# Altium footprint library Transformers.PcbLib: 102 footprints (part 7 of 7)
Each footprint in its own frame and in the unit in brackets; x right, y up, seen from the top. Pads: shape width x height; smd on the part's side, far side on the other; paste and mask are expansions set on the pad; w line width, h text height; cw(c..) or ccw(c..) is an arc to the next point about the centre after c.
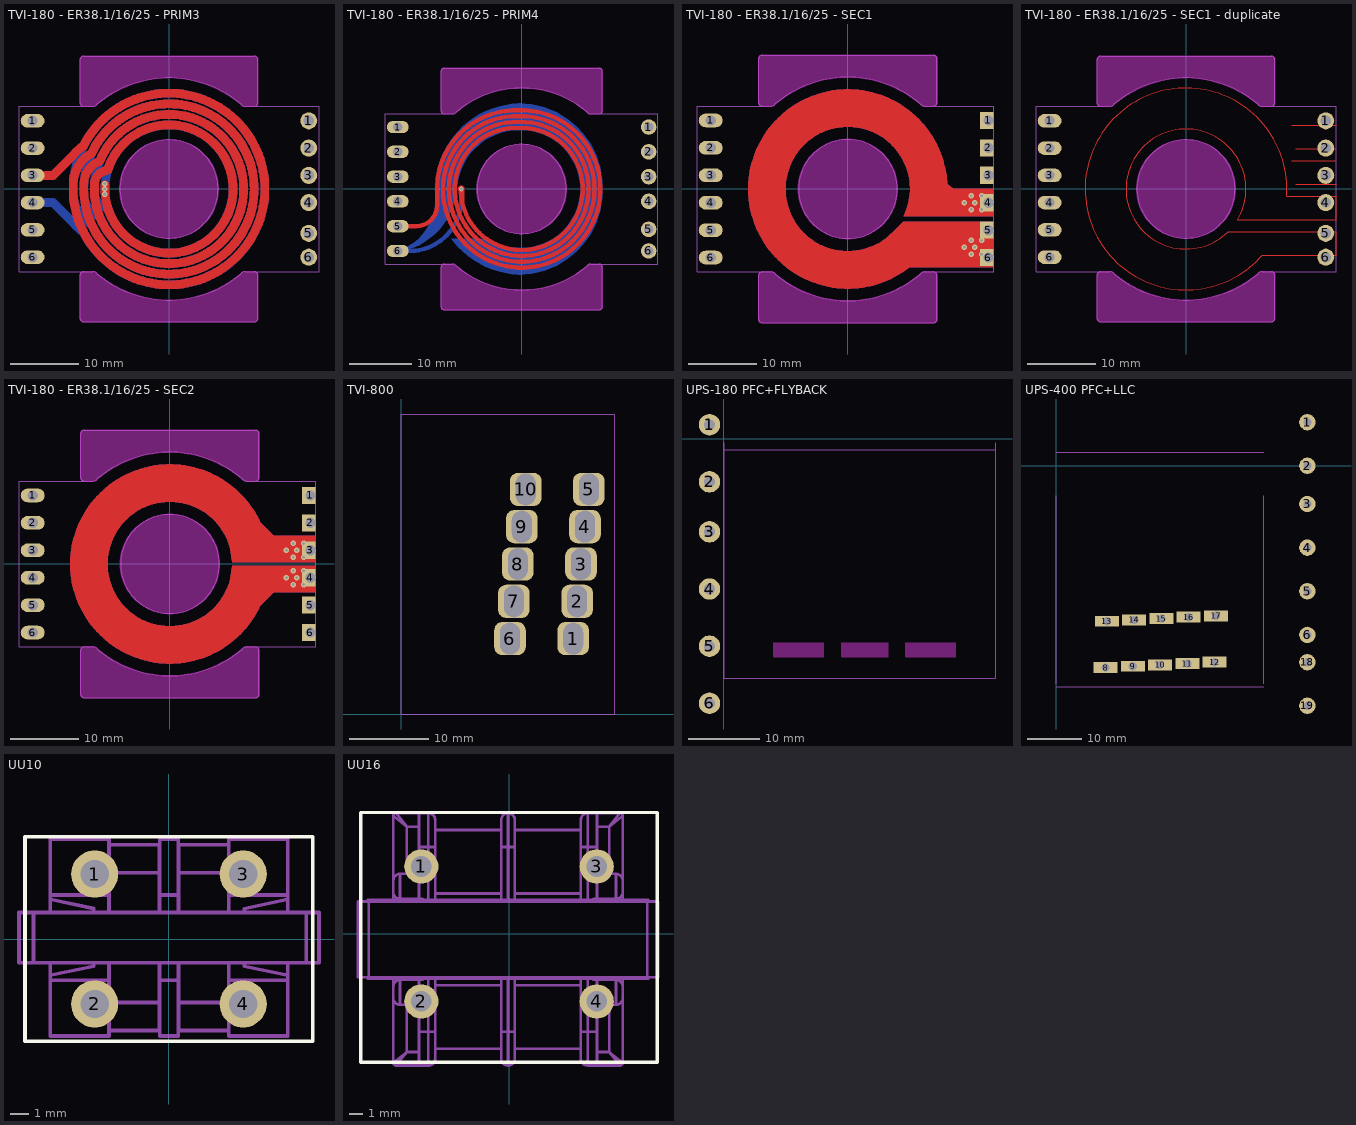
[diagram p6: the footprints below, top view; thin cyan lines are the x and y axes]

## TVI-180 - ER38.1/16/25 - PRIM3 [mm]
pads (12):
  oval 3.5x2 hole 1.5: 1(-20,10) 2(-20,6) 3(-20,2) 4(-20,-2) 5(-20,-6) 6(-20,-10)
  round 2.5 hole 1.5: 1(20.5,10) 2(20.5,6) 3(20.5,2) 4(20.5,-2) 5(20.5,-6.5) 6(20.5,-10)
via -9.41,0.8 diameter 0.8 hole 0.5
via -9.41,0 diameter 0.8 hole 0.5
via -9.41,-0.8 diameter 0.8 hole 0.5
Top Layer:
  lines w1.3: -20.5,2 -17,2 -14.25,4.75 ; -14.091,4.919 cw(c-8.829,0.659) -12.55,6.315 ; -14.05,0.658 -14.05,0 ccw(c0,0) 0,-14.05 ccw(c0,0) 14.05,0 ccw(c0,0) -12.551,6.316 ; -14.049,0.659 cw(c-8.829,0.659) -11.382,5.212 ; -12.5,0.658 -12.5,0 ccw(c0,0) 0,-12.5 ccw(c0,0) 12.5,0 ccw(c0,0) -11.329,5.282 ; -12.499,0.659 cw(c-8.829,0.659) -10.265,4.036 ; -10.929,0.659 cw(c-8.829,0.659) -9.012,2.751 ; -10.927,0.716 ccw(c0,0) 0,-10.95 ccw(c0,0) 10.95,0 ccw(c0,0) -10.167,4.067 ; -9.382,0.586 ccw(c0,0) 0,-9.4 ccw(c0,0) 9.4,0 ccw(c0,0) -8.99,2.746
  text "3" at -18,11 h1.5
Bottom Layer:
  lines w1.3: -20.5,-2 -17,-2 -14.25,-4.75 ; -14.091,-4.919 ccw(c-8.829,-0.659) -12.55,-6.315 ; -14.05,-0.658 -14.05,0 cw(c0,0) 0,14.05 cw(c0,0) 14.05,0 cw(c0,0) -12.527,-6.363 ; -14.049,-0.659 ccw(c-8.829,-0.659) -11.382,-5.212 ; -12.499,-0.659 ccw(c-8.829,-0.659) -10.265,-4.036 ; -12.5,-0.658 -12.5,0 cw(c0,0) 0,12.5 cw(c0,0) 12.5,0 cw(c0,0) -11.329,-5.282 ; -10.929,-0.659 ccw(c-8.829,-0.659) -9.012,-2.751 ; -10.927,-0.716 cw(c0,0) 0,10.95 cw(c0,0) 10.95,0 cw(c0,0) -10.167,-4.067 ; -9.382,-0.586 cw(c0,0) 0,9.4 cw(c0,0) 9.4,0 cw(c0,0) -8.99,-2.746
Keep-Out Layer:
  drawing of 3 lines, arcs and shapes, not listed
Mechanical 2:
  circle w0.15: c0,0 r7.2
  lines w0.15: -22,-0.5 -22,12.103 -12.501,12.103 -11.15,12.103 ccw(c-11.15,12.771) -10.679,12.299 -10.562,12.416 cw(c0,0) 0.251,16.298 ; -22,0.5 -22,-12.103 -12.501,-12.103 -11.15,-12.103 cw(c-11.15,-12.771) -10.679,-12.299 -10.562,-12.416 ccw(c0,0) 0.251,-16.298 ; -0.251,-16.298 ccw(c0,0) 10.562,-12.415 10.679,-12.299 ; -0.251,16.298 cw(c0,0) 10.562,12.415 10.679,12.299 ; 22,-0.5 22,12.103 12.501,12.103 ; 22,0.5 22,-12.103 12.501,-12.103 ; 10.679,-12.299 cw(c11.15,-12.771) 11.15,-12.103 ; 10.679,-12.299 cw(c11.15,-12.771) 11.15,-12.103 ; 10.679,12.299 ccw(c11.15,12.771) 11.15,12.103 ; 10.679,12.299 ccw(c11.15,12.771) 11.15,12.103 ; 11.15,-12.103 12.501,-12.103 ; 11.15,-12.103 12.501,-12.103 ; 11.15,12.103 12.501,12.103 ; 11.15,12.103 12.501,12.103
Top Assembly:
  circle w0.15: c0,0 r7.2
  lines w0.15: -0.251,16.298 cw(c0,0) 10.561,12.416 10.678,12.299 ccw(c11.15,12.771) 11.15,12.103 12.5,12.103 ccw(c12.5,12.603) 13,12.603 13,19 ccw(c12.5,19) 12.5,19.5 -12.5,19.5 ccw(c-12.5,19) -13,19 -13,12.603 ccw(c-12.5,12.603) -12.5,12.103 -11.15,12.103 ccw(c-11.15,12.771) -10.679,12.299 -10.562,12.416 cw(c0,0) 0.251,16.298 ; -13,-19 ccw(c-12.5,-19) -12.5,-19.5 ; -13,-19 ccw(c-12.5,-19) -12.5,-19.5 ; -13,-19 -13,-12.603 ; -13,-19 -13,-12.603 ; -13,-12.603 cw(c-12.5,-12.603) -12.5,-12.103 ; -13,-12.603 cw(c-12.5,-12.603) -12.5,-12.103 ; -12.5,-19.5 12.5,-19.5 ; -12.5,-19.5 12.5,-19.5 ; -12.5,-12.103 -11.15,-12.103 ; -12.5,-12.103 -11.15,-12.103 ; -11.15,-12.103 cw(c-11.15,-12.771) -10.679,-12.299 ; -11.15,-12.103 cw(c-11.15,-12.771) -10.679,-12.299 ; -10.679,-12.299 -10.562,-12.416 ; -10.679,-12.299 -10.562,-12.416 ; -10.561,-12.416 ccw(c0,0) 0.251,-16.298 cw(c0,0) -10.561,-12.416 ; 10.561,-12.416 cw(c0,0) -0.251,-16.298 ccw(c0,0) 10.561,-12.416 ; 10.561,-12.416 10.678,-12.299 ; 10.561,-12.416 10.678,-12.299 ; 10.678,-12.299 cw(c11.15,-12.771) 11.15,-12.103 ; 10.678,-12.299 cw(c11.15,-12.771) 11.15,-12.103 ; 11.15,-12.103 12.5,-12.103 ; 11.15,-12.103 12.5,-12.103 ; 12.5,-19.5 ccw(c12.5,-19) 13,-19 ; 12.5,-19.5 ccw(c12.5,-19) 13,-19 ; 12.5,-12.103 cw(c12.5,-12.603) 13,-12.603 ; 12.5,-12.103 cw(c12.5,-12.603) 13,-12.603 ; 13,-19 13,-12.603 ; 13,-19 13,-12.603
3D body "ER38.1-16-25.STEP": height 5, standoff -3, extent -12.7,-19.05 12.7,19.05

## TVI-180 - ER38.1/16/25 - PRIM4 [mm]
pads (12):
  oval 3.5x2 hole 1.5: 1(-20,10) 2(-20,6) 3(-20,2) 4(-20,-2) 5(-20,-6) 6(-20,-10)
  round 2.5 hole 1.5: 1(20.5,10) 2(20.5,6) 3(20.5,2) 4(20.5,-2) 5(20.5,-6.5) 6(20.5,-10)
via -9.75,0 diameter 0.8 hole 0.5
Top Layer:
  region: -9.5,1.25
  region: -9.3,-2.4 -9.25,0.25 -9.5,0.5 -10,0.5 -10.2,0.3 -10.2,-0.1
  lines w0.7: -20.256,-5.994 -17,-5.994 ccw(c-17,-2.644) -13.65,-2.644 -13.65,0 cw(c-0.95,0) -0.95,12.7 ; -9.85,0 ccw(c0,0) 0,-9.85 ccw(c0,0) 9.85,0 ccw(c0,0) 0,9.85 -0.95,9.85 ccw(c-0.95,0) -10.8,0 ccw(c0,0) 0,-10.8 ccw(c0,0) 10.8,0 ccw(c0,0) 0,10.8 -0.95,10.8 ccw(c-0.95,0) -11.75,0 ccw(c0,0) 0,-11.75 ccw(c0,0) 11.75,0 ccw(c0,0) 0,11.75 -0.95,11.75 ccw(c-0.95,0) -12.7,0 ccw(c0,0) 0,-12.7 ccw(c0,0) 12.7,0 ccw(c0,0) 0,12.7 ; -0.966,12.7 -0.016,12.7
  lines w1.3: -20.194,6.306 -20,6
  text "4" at -18,11 h1.5
Bottom Layer:
  region: -9.3,0.4
  region: -10,2
  region: -10.5,-0.19 -10.467,0.305 -10.33,1.288 -10.096,2.253 -9.769,3.19 -9.352,4.091 -8.849,4.946 -8.264,5.748 -7.603,6.489 -6.873,7.161 -6.081,7.759 -5.233,8.276 -4.34,8.707 -3.408,9.049 -2.447,9.298 -1.466,9.452 -0.475,9.508 0.021,9.5 0.491,9.483 1.426,9.381 2.347,9.187 3.244,8.904 4.109,8.535 4.933,8.082 5.71,7.551 6.43,6.946 7.088,6.274 7.677,5.54 8.191,4.753 8.625,3.918 8.975,3.045 9.238,2.142 9.412,1.218 9.494,0.281 9.5,-0.19 13.021,-0.19 13.041,0.341 12.997,1.401 12.869,2.455 12.66,3.496 12.37,4.517 12,5.512 11.553,6.475 11.033,7.4 10.441,8.281 9.782,9.114 9.059,9.892 8.278,10.61 7.443,11.266 6.559,11.853 5.632,12.37 4.667,12.812 3.67,13.178 2.648,13.463 1.606,13.668 0.551,13.791 0.021,13.81 -0.529,13.81 -1.626,13.724 -2.712,13.552 -3.782,13.295 -4.828,12.955 -5.845,12.534 -6.825,12.035 -7.763,11.46 -8.653,10.813 -9.49,10.099 -10.267,9.321 -10.982,8.484 -11.629,7.594 -12.203,6.656 -12.703,5.676 -13.124,4.66 -13.464,3.613 -13.721,2.544 -13.893,1.457 -13.979,0.36 -13.979,-0.19
  region: -5.709,-8 -5.385,-8.191 -4.719,-8.538 -4.028,-8.833 -3.318,-9.077 -2.591,-9.267 -1.852,-9.403 -1.105,-9.484 -0.355,-9.508 0.021,-9.5 0.491,-9.483 1.426,-9.381 2.347,-9.187 3.244,-8.904 4.109,-8.535 4.933,-8.082 5.71,-7.551 6.43,-6.946 7.088,-6.274 7.677,-5.54 8.191,-4.753 8.625,-3.918 8.975,-3.045 9.238,-2.142 9.412,-1.218 9.494,-0.281 9.5,0.19 13.021,0.19 13.041,-0.341 12.997,-1.401 12.869,-2.455 12.66,-3.496 12.37,-4.517 12,-5.512 11.553,-6.475 11.033,-7.4 10.441,-8.281 9.782,-9.114 9.059,-9.892 8.278,-10.61 7.443,-11.266 6.559,-11.853 5.632,-12.37 4.667,-12.812 3.67,-13.178 2.648,-13.463 1.606,-13.668 0.551,-13.791 0.021,-13.81 -0.531,-13.81 -1.632,-13.723 -2.722,-13.55 -3.796,-13.291 -4.845,-12.949 -5.865,-12.525 -6.848,-12.022 -7.788,-11.443 -8.68,-10.792 -9.518,-10.073 -10.296,-9.29 -11.011,-8.448 -11.334,-8
  region: -18.6,-9.425 -18.194,-9.194 -17.422,-8.671 -16.708,-8.07 -16.061,-7.398 -15.488,-6.662 -14.994,-5.87 -14.585,-5.031 -14.267,-4.154 -14.041,-3.249 -13.911,-2.325 -13.878,-1.392 -13.942,-0.462 -14.011,0 -10.489,0 -10.533,-0.483 -10.703,-1.439 -10.953,-2.377 -11.282,-3.29 -11.688,-4.172 -12.168,-5.017 -12.717,-5.817 -13.333,-6.567 -14.01,-7.263 -14.744,-7.898 -15.53,-8.469 -16.361,-8.97 -17.232,-9.399 -18.136,-9.753 -19.067,-10.028 -20.018,-10.222 -20.5,-10.279
  lines w0.7: -20,-10 -18.081,-10 ccw(c-18.081,-1.669) -9.75,-1.669 -9.75,0
Keep-Out Layer:
  drawing of 3 lines, arcs and shapes, not listed
Mechanical 2:
  circle w0.15: c0,0 r7.2
  lines w0.15: -22,-0.5 -22,12.103 -12.501,12.103 -11.15,12.103 ccw(c-11.15,12.771) -10.679,12.299 -10.562,12.416 cw(c0,0) 0.251,16.298 ; -22,0.5 -22,-12.103 -12.501,-12.103 -11.15,-12.103 cw(c-11.15,-12.771) -10.679,-12.299 -10.562,-12.416 ccw(c0,0) 0.251,-16.298 ; -0.251,-16.298 ccw(c0,0) 10.562,-12.415 10.679,-12.299 ; -0.251,16.298 cw(c0,0) 10.562,12.415 10.679,12.299 ; 22,-0.5 22,12.103 12.501,12.103 ; 22,0.5 22,-12.103 12.501,-12.103 ; 10.679,-12.299 cw(c11.15,-12.771) 11.15,-12.103 ; 10.679,-12.299 cw(c11.15,-12.771) 11.15,-12.103 ; 10.679,12.299 ccw(c11.15,12.771) 11.15,12.103 ; 10.679,12.299 ccw(c11.15,12.771) 11.15,12.103 ; 11.15,-12.103 12.501,-12.103 ; 11.15,-12.103 12.501,-12.103 ; 11.15,12.103 12.501,12.103 ; 11.15,12.103 12.501,12.103
Top Assembly:
  circle w0.15: c0,0 r7.2
  lines w0.15: -0.251,16.298 cw(c0,0) 10.561,12.416 10.678,12.299 ccw(c11.15,12.771) 11.15,12.103 12.5,12.103 ccw(c12.5,12.603) 13,12.603 13,19 ccw(c12.5,19) 12.5,19.5 -12.5,19.5 ccw(c-12.5,19) -13,19 -13,12.603 ccw(c-12.5,12.603) -12.5,12.103 -11.15,12.103 ccw(c-11.15,12.771) -10.679,12.299 -10.562,12.416 cw(c0,0) 0.251,16.298 ; -13,-19 ccw(c-12.5,-19) -12.5,-19.5 ; -13,-19 ccw(c-12.5,-19) -12.5,-19.5 ; -13,-19 -13,-12.603 ; -13,-19 -13,-12.603 ; -13,-12.603 cw(c-12.5,-12.603) -12.5,-12.103 ; -13,-12.603 cw(c-12.5,-12.603) -12.5,-12.103 ; -12.5,-19.5 12.5,-19.5 ; -12.5,-19.5 12.5,-19.5 ; -12.5,-12.103 -11.15,-12.103 ; -12.5,-12.103 -11.15,-12.103 ; -11.15,-12.103 cw(c-11.15,-12.771) -10.679,-12.299 ; -11.15,-12.103 cw(c-11.15,-12.771) -10.679,-12.299 ; -10.679,-12.299 -10.562,-12.416 ; -10.679,-12.299 -10.562,-12.416 ; -10.561,-12.416 ccw(c0,0) 0.251,-16.298 cw(c0,0) -10.561,-12.416 ; 10.561,-12.416 cw(c0,0) -0.251,-16.298 ccw(c0,0) 10.561,-12.416 ; 10.561,-12.416 10.678,-12.299 ; 10.561,-12.416 10.678,-12.299 ; 10.678,-12.299 cw(c11.15,-12.771) 11.15,-12.103 ; 10.678,-12.299 cw(c11.15,-12.771) 11.15,-12.103 ; 11.15,-12.103 12.5,-12.103 ; 11.15,-12.103 12.5,-12.103 ; 12.5,-19.5 ccw(c12.5,-19) 13,-19 ; 12.5,-19.5 ccw(c12.5,-19) 13,-19 ; 12.5,-12.103 cw(c12.5,-12.603) 13,-12.603 ; 12.5,-12.103 cw(c12.5,-12.603) 13,-12.603 ; 13,-19 13,-12.603 ; 13,-19 13,-12.603
3D body "ER38.1-16-25.STEP": height 5, standoff -3, extent -12.7,-19.05 12.7,19.05

## TVI-180 - ER38.1/16/25 - SEC1 [mm]
pads (12):
  oval 3.5x2 hole 1.5: 1(-20,10) 2(-20,6) 3(-20,2) 4(-20,-2) 5(-20,-6) 6(-20,-10)
  rect 2x2.5 hole 1.5 copper offset -0.25,0: 1(20.5,10) 2(20.5,6) 3(20.5,2) 4(20.5,-2) 5(20.5,-6) 6(20.5,-10)
via 18,-9.5 diameter 0.8 hole 0.4
via 18,-7.5 diameter 0.8 hole 0.4
via 17,-8.5 diameter 0.8 hole 0.4
via 18,-3 diameter 0.8 hole 0.4
via 18,-1 diameter 0.8 hole 0.4
via 17,-2 diameter 0.8 hole 0.4
via 19.5,-3 diameter 0.8 hole 0.4
via 19.5,-1 diameter 0.8 hole 0.4
via 18.5,-2 diameter 0.8 hole 0.4
via 19.5,-9.5 diameter 0.8 hole 0.4
via 19.5,-7.5 diameter 0.8 hole 0.4
via 18.5,-8.5 diameter 0.8 hole 0.4
Top Layer:
  region: 5.532,-11.425 9.825,-11.425 13.775,-11.425 21.3,-11.425 21.3,-4.75 8.05,-4.75 3.454,-9.346
  region: 15.376,0 21.3,0 21.3,-4 8.171,-4 8.33,-3.62 8.605,-2.843 8.824,-2.049 8.983,-1.24 9.083,-0.422 9.123,0.401 9.102,1.225 9.021,2.045 8.958,2.452 11.712,3.003
  lines w1.3: -20.194,6.306 -20,6
  lines w5.5: 8.404,-8.284 cw(c0,0) 0,-11.8 cw(c0,0) -11.8,0 cw(c0,0) 0,11.8 cw(c0,0) 11.759,-0.98
  text "4" at -18,11 h1.5
Bottom Layer:
  region: 5.532,-11.425 9.825,-11.425 13.775,-11.425 21.3,-11.425 21.3,-4.75 8.05,-4.75 3.454,-9.346
  region: 15.376,0 21.3,0 21.3,-4 8.171,-4 8.33,-3.62 8.605,-2.843 8.824,-2.049 8.983,-1.24 9.083,-0.422 9.123,0.401 9.102,1.225 9.021,2.045 8.958,2.452 11.712,3.003
  lines w5.5: 8.404,-8.284 cw(c0,0) 0,-11.8 cw(c0,0) -11.8,0 cw(c0,0) 0,11.8 cw(c0,0) 11.759,-0.98
  text "6" at -18,11.75 h1.5
Keep-Out Layer:
  drawing of 3 lines, arcs and shapes, not listed
Mechanical 2:
  circle w0.15: c0,0 r7.2
  lines w0.15: -22,-0.5 -22,12.103 -12.501,12.103 -11.15,12.103 ccw(c-11.15,12.771) -10.679,12.299 -10.562,12.416 cw(c0,0) 0.251,16.298 ; -22,0.5 -22,-12.103 -12.501,-12.103 -11.15,-12.103 cw(c-11.15,-12.771) -10.679,-12.299 -10.562,-12.416 ccw(c0,0) 0.251,-16.298 ; -0.251,-16.298 ccw(c0,0) 10.562,-12.415 10.679,-12.299 ; -0.251,16.298 cw(c0,0) 10.562,12.415 10.679,12.299 ; 21.3,-0.5 21.3,12.103 12.501,12.103 ; 21.3,0.5 21.3,-12.103 12.501,-12.103 ; 10.679,-12.299 cw(c11.15,-12.771) 11.15,-12.103 ; 10.679,-12.299 cw(c11.15,-12.771) 11.15,-12.103 ; 10.679,12.299 ccw(c11.15,12.771) 11.15,12.103 ; 10.679,12.299 ccw(c11.15,12.771) 11.15,12.103 ; 11.15,-12.103 12.501,-12.103 ; 11.15,-12.103 12.501,-12.103 ; 11.15,12.103 12.501,12.103 ; 11.15,12.103 12.501,12.103
Top Assembly:
  circle w0.15: c0,0 r7.2
  lines w0.15: -0.251,16.298 cw(c0,0) 10.561,12.416 10.678,12.299 ccw(c11.15,12.771) 11.15,12.103 12.5,12.103 ccw(c12.5,12.603) 13,12.603 13,19 ccw(c12.5,19) 12.5,19.5 -12.5,19.5 ccw(c-12.5,19) -13,19 -13,12.603 ccw(c-12.5,12.603) -12.5,12.103 -11.15,12.103 ccw(c-11.15,12.771) -10.679,12.299 -10.562,12.416 cw(c0,0) 0.251,16.298 ; -13,-19 ccw(c-12.5,-19) -12.5,-19.5 ; -13,-19 ccw(c-12.5,-19) -12.5,-19.5 ; -13,-19 -13,-12.603 ; -13,-19 -13,-12.603 ; -13,-12.603 cw(c-12.5,-12.603) -12.5,-12.103 ; -13,-12.603 cw(c-12.5,-12.603) -12.5,-12.103 ; -12.5,-19.5 12.5,-19.5 ; -12.5,-19.5 12.5,-19.5 ; -12.5,-12.103 -11.15,-12.103 ; -12.5,-12.103 -11.15,-12.103 ; -11.15,-12.103 cw(c-11.15,-12.771) -10.679,-12.299 ; -11.15,-12.103 cw(c-11.15,-12.771) -10.679,-12.299 ; -10.679,-12.299 -10.562,-12.416 ; -10.679,-12.299 -10.562,-12.416 ; -10.561,-12.416 ccw(c0,0) 0.251,-16.298 cw(c0,0) -10.561,-12.416 ; 10.561,-12.416 cw(c0,0) -0.251,-16.298 ccw(c0,0) 10.561,-12.416 ; 10.561,-12.416 10.678,-12.299 ; 10.561,-12.416 10.678,-12.299 ; 10.678,-12.299 cw(c11.15,-12.771) 11.15,-12.103 ; 10.678,-12.299 cw(c11.15,-12.771) 11.15,-12.103 ; 11.15,-12.103 12.5,-12.103 ; 11.15,-12.103 12.5,-12.103 ; 12.5,-19.5 ccw(c12.5,-19) 13,-19 ; 12.5,-19.5 ccw(c12.5,-19) 13,-19 ; 12.5,-12.103 cw(c12.5,-12.603) 13,-12.603 ; 12.5,-12.103 cw(c12.5,-12.603) 13,-12.603 ; 13,-19 13,-12.603 ; 13,-19 13,-12.603
3D body "ER38.1-16-25.STEP": height 5, standoff -3, extent -12.7,-19.05 12.7,19.05

## TVI-180 - ER38.1/16/25 - SEC1 - duplicate [mm]
pads (12):
  oval 3.5x2 hole 1.5: 1(-20,10) 2(-20,6) 3(-20,2) 4(-20,-2) 5(-20,-6) 6(-20,-10)
  round 2.5 hole 1.5: 1(20.5,10) 2(20.5,6) 3(20.5,2) 4(20.5,-2) 5(20.5,-6.5) 6(20.5,-10)
Top Layer:
  lines w0.15: -0.228,-14.798 ccw(c0,0) 11.168,-9.711 15.5,-9.711 22,-9.711 22,-6.269 16.06,-6.269 6.162,-6.269 ; 0.228,-14.798 cw(c0,0) 14.763,-1.041 ; 6.162,-6.282 cw(c0,0) 7.558,-4.507 ; 7.546,-4.5 16.06,-4.5 22,-4.5 22,-1.058 15.5,-1.058 14.763,-1.058 ; 15.5,4.154 22,4.154 ; 15.5,9.365 22,9.365 ; 16.06,0.711 22,0.711 ; 16.06,5.923 22,5.923
  lines w1.3: -20.194,6.306 -20,6
  text "4" at -18,11 h1.5
Keep-Out Layer:
  drawing of 3 lines, arcs and shapes, not listed
Mechanical 2:
  circle w0.15: c0,0 r7.2
  lines w0.15: -22,-0.5 -22,12.103 -12.501,12.103 -11.15,12.103 ccw(c-11.15,12.771) -10.679,12.299 -10.562,12.416 cw(c0,0) 0.251,16.298 ; -22,0.5 -22,-12.103 -12.501,-12.103 -11.15,-12.103 cw(c-11.15,-12.771) -10.679,-12.299 -10.562,-12.416 ccw(c0,0) 0.251,-16.298 ; -0.251,-16.298 ccw(c0,0) 10.562,-12.415 10.679,-12.299 ; -0.251,16.298 cw(c0,0) 10.562,12.415 10.679,12.299 ; 22,-0.5 22,12.103 12.501,12.103 ; 22,0.5 22,-12.103 12.501,-12.103 ; 10.679,-12.299 cw(c11.15,-12.771) 11.15,-12.103 ; 10.679,-12.299 cw(c11.15,-12.771) 11.15,-12.103 ; 10.679,12.299 ccw(c11.15,12.771) 11.15,12.103 ; 10.679,12.299 ccw(c11.15,12.771) 11.15,12.103 ; 11.15,-12.103 12.501,-12.103 ; 11.15,-12.103 12.501,-12.103 ; 11.15,12.103 12.501,12.103 ; 11.15,12.103 12.501,12.103
Top Assembly:
  circle w0.15: c0,0 r7.2
  lines w0.15: -0.251,16.298 cw(c0,0) 10.561,12.416 10.678,12.299 ccw(c11.15,12.771) 11.15,12.103 12.5,12.103 ccw(c12.5,12.603) 13,12.603 13,19 ccw(c12.5,19) 12.5,19.5 -12.5,19.5 ccw(c-12.5,19) -13,19 -13,12.603 ccw(c-12.5,12.603) -12.5,12.103 -11.15,12.103 ccw(c-11.15,12.771) -10.679,12.299 -10.562,12.416 cw(c0,0) 0.251,16.298 ; -13,-19 ccw(c-12.5,-19) -12.5,-19.5 ; -13,-19 ccw(c-12.5,-19) -12.5,-19.5 ; -13,-19 -13,-12.603 ; -13,-19 -13,-12.603 ; -13,-12.603 cw(c-12.5,-12.603) -12.5,-12.103 ; -13,-12.603 cw(c-12.5,-12.603) -12.5,-12.103 ; -12.5,-19.5 12.5,-19.5 ; -12.5,-19.5 12.5,-19.5 ; -12.5,-12.103 -11.15,-12.103 ; -12.5,-12.103 -11.15,-12.103 ; -11.15,-12.103 cw(c-11.15,-12.771) -10.679,-12.299 ; -11.15,-12.103 cw(c-11.15,-12.771) -10.679,-12.299 ; -10.679,-12.299 -10.562,-12.416 ; -10.679,-12.299 -10.562,-12.416 ; -10.561,-12.416 ccw(c0,0) 0.251,-16.298 cw(c0,0) -10.561,-12.416 ; 10.561,-12.416 cw(c0,0) -0.251,-16.298 ccw(c0,0) 10.561,-12.416 ; 10.561,-12.416 10.678,-12.299 ; 10.561,-12.416 10.678,-12.299 ; 10.678,-12.299 cw(c11.15,-12.771) 11.15,-12.103 ; 10.678,-12.299 cw(c11.15,-12.771) 11.15,-12.103 ; 11.15,-12.103 12.5,-12.103 ; 11.15,-12.103 12.5,-12.103 ; 12.5,-19.5 ccw(c12.5,-19) 13,-19 ; 12.5,-19.5 ccw(c12.5,-19) 13,-19 ; 12.5,-12.103 cw(c12.5,-12.603) 13,-12.603 ; 12.5,-12.103 cw(c12.5,-12.603) 13,-12.603 ; 13,-19 13,-12.603 ; 13,-19 13,-12.603
3D body "ER38.1-16-25.STEP": height 5, standoff -3, extent -12.7,-19.05 12.7,19.05

## TVI-180 - ER38.1/16/25 - SEC2 [mm]
pads (12):
  oval 3.5x2 hole 1.5: 1(-20,10) 2(-20,6) 3(-20,2) 4(-20,-2) 5(-20,-6) 6(-20,-10)
  rect 2x2.5 hole 1.5 copper offset -0.25,0: 1(20.5,10) 2(20.5,6) 3(20.5,2) 4(20.5,-2) 5(20.5,-6) 6(20.5,-10)
via 18,-3 diameter 0.8 hole 0.4
via 18,-1 diameter 0.8 hole 0.4
via 17,-2 diameter 0.8 hole 0.4
via 18,1 diameter 0.8 hole 0.4
via 18,3 diameter 0.8 hole 0.4
via 17,2 diameter 0.8 hole 0.4
via 19.5,1 diameter 0.8 hole 0.4
via 19.5,3 diameter 0.8 hole 0.4
via 18.5,2 diameter 0.8 hole 0.4
via 18.5,-2 diameter 0.8 hole 0.4
via 19.5,-1 diameter 0.8 hole 0.4
via 19.5,-3 diameter 0.8 hole 0.4
Top Layer:
  region: 9.1,0.275 15.075,0.275 21.3,0.275 21.3,4.125 15.15,4.125 12.075,7.2 9.335,7.2 8.7,2.6
  region: 9.1,-0.275 15.075,-0.275 21.3,-0.275 21.3,-4.125 15.15,-4.125 12.075,-7.2 9.335,-7.2 8.7,-2.6
  lines w1.3: -20.194,6.306 -20,6
  lines w5.5: 11.208,-3.692 cw(c0,0) 0,-11.8 cw(c0,0) -11.8,0 cw(c0,0) 0,11.8 cw(c0,0) 11.384,3.105
  text "5" at -18,11 h1.5
Bottom Layer:
  region: 9.1,0.275 15.075,0.275 21.3,0.275 21.3,4.125 15.15,4.125 12.075,7.2 9.335,7.2 8.7,2.6
  region: 9.1,-0.275 15.075,-0.275 21.3,-0.275 21.3,-4.125 15.15,-4.125 12.075,-7.2 9.335,-7.2 8.7,-2.6
  lines w5.5: 11.208,-3.692 cw(c0,0) 0,-11.8 cw(c0,0) -11.8,0 cw(c0,0) 0,11.8 cw(c0,0) 11.384,3.105
Keep-Out Layer:
  drawing of 3 lines, arcs and shapes, not listed
Mechanical 2:
  circle w0.15: c0,0 r7.2
  lines w0.15: -22,-0.5 -22,12.103 -12.501,12.103 -11.15,12.103 ccw(c-11.15,12.771) -10.679,12.299 -10.562,12.416 cw(c0,0) 0.251,16.298 ; -22,0.5 -22,-12.103 -12.501,-12.103 -11.15,-12.103 cw(c-11.15,-12.771) -10.679,-12.299 -10.562,-12.416 ccw(c0,0) 0.251,-16.298 ; -0.251,-16.298 ccw(c0,0) 10.562,-12.415 10.679,-12.299 ; -0.251,16.298 cw(c0,0) 10.562,12.415 10.679,12.299 ; 21.3,-0.5 21.3,12.103 12.501,12.103 ; 21.3,0.5 21.3,-12.103 12.501,-12.103 ; 10.679,-12.299 cw(c11.15,-12.771) 11.15,-12.103 ; 10.679,-12.299 cw(c11.15,-12.771) 11.15,-12.103 ; 10.679,12.299 ccw(c11.15,12.771) 11.15,12.103 ; 10.679,12.299 ccw(c11.15,12.771) 11.15,12.103 ; 11.15,-12.103 12.501,-12.103 ; 11.15,-12.103 12.501,-12.103 ; 11.15,12.103 12.501,12.103 ; 11.15,12.103 12.501,12.103
Top Assembly:
  circle w0.15: c0,0 r7.2
  lines w0.15: -0.251,16.298 cw(c0,0) 10.561,12.416 10.678,12.299 ccw(c11.15,12.771) 11.15,12.103 12.5,12.103 ccw(c12.5,12.603) 13,12.603 13,19 ccw(c12.5,19) 12.5,19.5 -12.5,19.5 ccw(c-12.5,19) -13,19 -13,12.603 ccw(c-12.5,12.603) -12.5,12.103 -11.15,12.103 ccw(c-11.15,12.771) -10.679,12.299 -10.562,12.416 cw(c0,0) 0.251,16.298 ; -13,-19 ccw(c-12.5,-19) -12.5,-19.5 ; -13,-19 ccw(c-12.5,-19) -12.5,-19.5 ; -13,-19 -13,-12.603 ; -13,-19 -13,-12.603 ; -13,-12.603 cw(c-12.5,-12.603) -12.5,-12.103 ; -13,-12.603 cw(c-12.5,-12.603) -12.5,-12.103 ; -12.5,-19.5 12.5,-19.5 ; -12.5,-19.5 12.5,-19.5 ; -12.5,-12.103 -11.15,-12.103 ; -12.5,-12.103 -11.15,-12.103 ; -11.15,-12.103 cw(c-11.15,-12.771) -10.679,-12.299 ; -11.15,-12.103 cw(c-11.15,-12.771) -10.679,-12.299 ; -10.679,-12.299 -10.562,-12.416 ; -10.679,-12.299 -10.562,-12.416 ; -10.561,-12.416 ccw(c0,0) 0.251,-16.298 cw(c0,0) -10.561,-12.416 ; 10.561,-12.416 cw(c0,0) -0.251,-16.298 ccw(c0,0) 10.561,-12.416 ; 10.561,-12.416 10.678,-12.299 ; 10.561,-12.416 10.678,-12.299 ; 10.678,-12.299 cw(c11.15,-12.771) 11.15,-12.103 ; 10.678,-12.299 cw(c11.15,-12.771) 11.15,-12.103 ; 11.15,-12.103 12.5,-12.103 ; 11.15,-12.103 12.5,-12.103 ; 12.5,-19.5 ccw(c12.5,-19) 13,-19 ; 12.5,-19.5 ccw(c12.5,-19) 13,-19 ; 12.5,-12.103 cw(c12.5,-12.603) 13,-12.603 ; 12.5,-12.103 cw(c12.5,-12.603) 13,-12.603 ; 13,-19 13,-12.603 ; 13,-19 13,-12.603
3D body "ER38.1-16-25.STEP": height 5, standoff -3, extent -12.7,-19.05 12.7,19.05

## TVI-800 [mm]
pads (10):
  rrect50% 4x4.2 hole 2.5 slot 4 at 90 deg: 1(21.75,9.55) 2(22.25,14.275) 3(22.75,19) 4(23.25,23.725) 5(23.75,28.45) 6(13.75,9.55) 7(14.25,14.275) 8(14.75,19) 9(15.25,23.725) 10(15.75,28.45)
Mechanical 2:
  lines w0.15: 12.85,7.6 14.65,7.6 ; 12.85,11.5 14.65,11.5 ; 12.9,7.6 cw(c12.9,8.1) 12.4,8.1 12.4,9.55 12.4,11 cw(c12.9,11) 12.9,11.5 ; 13.35,12.325 15.15,12.325 ; 13.35,16.225 15.15,16.225 ; 13.4,12.325 cw(c13.4,12.825) 12.9,12.825 12.9,14.275 12.9,15.725 cw(c13.4,15.725) 13.4,16.225 ; 13.85,17.05 15.65,17.05 ; 13.85,20.95 15.65,20.95 ; 13.9,17.05 cw(c13.9,17.55) 13.4,17.55 13.4,19 13.4,20.45 cw(c13.9,20.45) 13.9,20.95 ; 14.35,21.775 16.15,21.775 ; 14.35,25.675 16.15,25.675 ; 14.4,21.775 cw(c14.4,22.275) 13.9,22.275 13.9,23.725 13.9,25.175 cw(c14.4,25.175) 14.4,25.675 ; 14.6,7.6 ccw(c14.6,8.1) 15.1,8.1 15.1,9.55 15.1,11 ccw(c14.6,11) 14.6,11.5 ; 14.85,26.5 16.65,26.5 ; 14.85,30.4 16.65,30.4 ; 14.9,26.5 cw(c14.9,27) 14.4,27 14.4,28.45 14.4,29.9 cw(c14.9,29.9) 14.9,30.4 ; 15.1,12.325 ccw(c15.1,12.825) 15.6,12.825 15.6,14.275 15.6,15.725 ccw(c15.1,15.725) 15.1,16.225 ; 15.6,17.05 ccw(c15.6,17.55) 16.1,17.55 16.1,19 16.1,20.45 ccw(c15.6,20.45) 15.6,20.95 ; 16.1,21.775 ccw(c16.1,22.275) 16.6,22.275 16.6,23.725 16.6,25.175 ccw(c16.1,25.175) 16.1,25.675 ; 16.6,26.5 ccw(c16.6,27) 17.1,27 17.1,28.45 17.1,29.9 ccw(c16.6,29.9) 16.6,30.4 ; 20.85,7.6 22.65,7.6 ; 20.85,11.5 22.65,11.5 ; 20.9,7.6 cw(c20.9,8.1) 20.4,8.1 20.4,9.55 20.4,11 cw(c20.9,11) 20.9,11.5 ; 21.35,12.325 23.15,12.325 ; 21.35,16.225 23.15,16.225 ; 21.4,12.325 cw(c21.4,12.825) 20.9,12.825 20.9,14.275 20.9,15.725 cw(c21.4,15.725) 21.4,16.225 ; 21.85,17.05 23.65,17.05 ; 21.85,20.95 23.65,20.95 ; 21.9,17.05 cw(c21.9,17.55) 21.4,17.55 21.4,19 21.4,20.45 cw(c21.9,20.45) 21.9,20.95 ; 22.35,21.775 24.15,21.775 ; 22.35,25.675 24.15,25.675 ; 22.4,21.775 cw(c22.4,22.275) 21.9,22.275 21.9,23.725 21.9,25.175 cw(c22.4,25.175) 22.4,25.675 ; 22.6,7.6 ccw(c22.6,8.1) 23.1,8.1 23.1,9.55 23.1,11 ccw(c22.6,11) 22.6,11.5 ; 22.85,26.5 24.65,26.5 ; 22.85,30.4 24.65,30.4 ; 22.9,26.5 cw(c22.9,27) 22.4,27 22.4,28.45 22.4,29.9 cw(c22.9,29.9) 22.9,30.4 ; 23.1,12.325 ccw(c23.1,12.825) 23.6,12.825 23.6,14.275 23.6,15.725 ccw(c23.1,15.725) 23.1,16.225 ; 23.6,17.05 ccw(c23.6,17.55) 24.1,17.55 24.1,19 24.1,20.45 ccw(c23.6,20.45) 23.6,20.95 ; 24.1,21.775 ccw(c24.1,22.275) 24.6,22.275 24.6,23.725 24.6,25.175 ccw(c24.1,25.175) 24.1,25.675 ; 24.6,26.5 ccw(c24.6,27) 25.1,27 25.1,28.45 25.1,29.9 ccw(c24.6,29.9) 24.6,30.4 ; 0,0 0,38 27,38 27,0 0,0
Top Assembly:
  lines w0.15: 12.85,7.6 14.65,7.6 ; 12.85,11.5 14.65,11.5 ; 12.9,7.6 cw(c12.9,8.1) 12.4,8.1 12.4,9.55 12.4,11 cw(c12.9,11) 12.9,11.5 ; 13.35,12.325 15.15,12.325 ; 13.35,16.225 15.15,16.225 ; 13.4,12.325 cw(c13.4,12.825) 12.9,12.825 12.9,14.275 12.9,15.725 cw(c13.4,15.725) 13.4,16.225 ; 13.85,17.05 15.65,17.05 ; 13.85,20.95 15.65,20.95 ; 13.9,17.05 cw(c13.9,17.55) 13.4,17.55 13.4,19 13.4,20.45 cw(c13.9,20.45) 13.9,20.95 ; 14.35,21.775 16.15,21.775 ; 14.35,25.675 16.15,25.675 ; 14.4,21.775 cw(c14.4,22.275) 13.9,22.275 13.9,23.725 13.9,25.175 cw(c14.4,25.175) 14.4,25.675 ; 14.6,7.6 ccw(c14.6,8.1) 15.1,8.1 15.1,9.55 15.1,11 ccw(c14.6,11) 14.6,11.5 ; 14.85,26.5 16.65,26.5 ; 14.85,30.4 16.65,30.4 ; 14.9,26.5 cw(c14.9,27) 14.4,27 14.4,28.45 14.4,29.9 cw(c14.9,29.9) 14.9,30.4 ; 15.1,12.325 ccw(c15.1,12.825) 15.6,12.825 15.6,14.275 15.6,15.725 ccw(c15.1,15.725) 15.1,16.225 ; 15.6,17.05 ccw(c15.6,17.55) 16.1,17.55 16.1,19 16.1,20.45 ccw(c15.6,20.45) 15.6,20.95 ; 16.1,21.775 ccw(c16.1,22.275) 16.6,22.275 16.6,23.725 16.6,25.175 ccw(c16.1,25.175) 16.1,25.675 ; 16.6,26.5 ccw(c16.6,27) 17.1,27 17.1,28.45 17.1,29.9 ccw(c16.6,29.9) 16.6,30.4 ; 20.85,7.6 22.65,7.6 ; 20.85,11.5 22.65,11.5 ; 20.9,7.6 cw(c20.9,8.1) 20.4,8.1 20.4,9.55 20.4,11 cw(c20.9,11) 20.9,11.5 ; 21.35,12.325 23.15,12.325 ; 21.35,16.225 23.15,16.225 ; 21.4,12.325 cw(c21.4,12.825) 20.9,12.825 20.9,14.275 20.9,15.725 cw(c21.4,15.725) 21.4,16.225 ; 21.85,17.05 23.65,17.05 ; 21.85,20.95 23.65,20.95 ; 21.9,17.05 cw(c21.9,17.55) 21.4,17.55 21.4,19 21.4,20.45 cw(c21.9,20.45) 21.9,20.95 ; 22.35,21.775 24.15,21.775 ; 22.35,25.675 24.15,25.675 ; 22.4,21.775 cw(c22.4,22.275) 21.9,22.275 21.9,23.725 21.9,25.175 cw(c22.4,25.175) 22.4,25.675 ; 22.6,7.6 ccw(c22.6,8.1) 23.1,8.1 23.1,9.55 23.1,11 ccw(c22.6,11) 22.6,11.5 ; 22.85,26.5 24.65,26.5 ; 22.85,30.4 24.65,30.4 ; 22.9,26.5 cw(c22.9,27) 22.4,27 22.4,28.45 22.4,29.9 cw(c22.9,29.9) 22.9,30.4 ; 23.1,12.325 ccw(c23.1,12.825) 23.6,12.825 23.6,14.275 23.6,15.725 ccw(c23.1,15.725) 23.1,16.225 ; 23.6,17.05 ccw(c23.6,17.55) 24.1,17.55 24.1,19 24.1,20.45 ccw(c23.6,20.45) 23.6,20.95 ; 24.1,21.775 ccw(c24.1,22.275) 24.6,22.275 24.6,23.725 24.6,25.175 ccw(c24.1,25.175) 24.1,25.675 ; 24.6,26.5 ccw(c24.6,27) 25.1,27 25.1,28.45 25.1,29.9 ccw(c24.6,29.9) 24.6,30.4
3D body: height 31.33, standoff -5.33, extent 13.7,3.925 13.95,34.088
3D body: height 31, standoff 1, extent 13.95,3.925 14.15,33.933
3D body: height 31, standoff 1, extent 14.15,3.925 14.35,33.933
3D body: height 31.36, standoff -5.36, extent 14.35,3.925 14.55,34.088
3D body: height 31, standoff 1, extent 14.75,3.925 14.95,33.933
3D body: height 31, standoff 1, extent 14.55,3.925 14.75,33.933
3D body: height 31.36, standoff -5.36, extent 14.95,3.925 15.15,34.088
3D body: height 31, standoff 1, extent 15.15,3.925 15.35,33.933
3D body: height 31, standoff 1, extent 15.35,3.925 15.55,33.933
3D body: height 31.33, standoff -5.33, extent 15.55,3.925 15.8,34.088
3D body: height 31, standoff 1, extent 13.5,3.925 13.7,33.933
3D body: height 31, standoff 1, extent 13.3,3.925 13.5,33.933
3D body: height 31, standoff 1, extent 16,3.925 16.2,33.933
3D body: height 31, standoff 1, extent 15.8,3.925 16,33.933
3D body: height 31, standoff 1, extent 23.8,3.925 24,33.933
3D body: height 31, standoff 1, extent 24,3.925 24.2,33.933
3D body: height 31, standoff 1, extent 21.3,3.925 21.5,33.933
3D body: height 31, standoff 1, extent 21.5,3.925 21.7,33.933
3D body: height 31.33, standoff -5.33, extent 23.55,3.925 23.8,34.088
3D body: height 31, standoff 1, extent 23.35,3.925 23.55,33.933
3D body: height 31, standoff 1, extent 23.15,3.925 23.35,33.933
3D body: height 31.36, standoff -5.36, extent 22.95,3.925 23.15,34.088
3D body: height 31, standoff 1, extent 22.55,3.925 22.75,33.933
3D body: height 31, standoff 1, extent 22.75,3.925 22.95,33.933
3D body: height 31.36, standoff -5.36, extent 22.35,3.925 22.55,34.088
3D body: height 31, standoff 1, extent 22.15,3.925 22.35,33.933
3D body: height 31, standoff 1, extent 21.95,3.925 22.15,33.933
3D body: height 31.33, standoff -5.33, extent 21.7,3.925 21.95,34.088
3D body: height 28.5, standoff 3.5, extent 0,-0.05 3,38.05
3D body "ER38.1-16-25.STEP": height 28.7, standoff 3.3, extent 19,-0.05 27,38.05
3D body "ER38.1-16-25.STEP": height 28.7, standoff 3.3, extent 3,-0.05 11,38.05
3D body "ER38.1-16-25.STEP": height 28.7, standoff 3.3, extent 11,-0.05 19,38.05

## UPS-180 PFC+FLYBACK [mm]
pads (6):
  round 3 hole 1.5: 1(-2,2) 2(-2,-6) 3(-2,-13) 4(-2,-21) 5(-2,-29) 6(-2,-37)
Top Layer keep-out:
  lines w0.15: 7,-30.5 14,-30.5 14,-28.5 7,-28.5 7,-30.5 ; 16.5,-30.5 23,-30.5 23,-28.5 16.5,-28.5 16.5,-30.5 ; 25.5,-30.5 25.5,-28.5 32.5,-28.5 32.5,-30.5 25.5,-30.5
Keep-Out Layer:
  board cut-out: 7,-28.5 14,-28.5 14,-30.5 7,-30.5
  board cut-out: 16.5,-28.5 23,-28.5 23,-30.5 16.5,-30.5
  board cut-out: 25.5,-28.5 32.5,-28.5 32.5,-30.5 25.5,-30.5
Top Assembly:
  lines w0.15: 0,-1.5 38,-1.5 ; 0,-0.5 0,-33.5 38,-33.5 38,-0.5
3D body: height 5, standoff -5, extent 0,-1.5 5,-0.5
3D body: height 5, standoff -5, extent 33,-1.5 38,-0.5
3D body: height 5, standoff -5, extent 33,-34.5 38,-33.5
3D body: height 5, standoff -5, extent 0,-34.5 5,-33.5
3D body: height 28, standoff 3, extent -4.5,-34.5 42.5,-33.5
3D body: height 28, standoff 3, extent -4.5,-1.5 42.5,-0.5
3D body "ER38.1-16-25.STEP": height 28.2, standoff 2.8, extent -0.05,-33.5 38.05,-25.5
3D body "ER38.1-16-25.STEP": height 28.2, standoff 2.8, extent -0.05,-25.5 38.05,-17.5
3D body "ER38.1-16-25.STEP": height 28.2, standoff 2.8, extent -0.05,-9.5 38.05,-1.5
3D body "ER38.1-16-25.STEP": height 28.2, standoff 2.8, extent -0.05,-17.5 38.05,-9.5

## UPS-400 PFC+LLC [mm]
pads (18):
  round 3 hole 1.5: 1(46,8) 2(46,0) 3(46,-7) 4(46,-15) 5(46,-23) 6(46,-31) 18(46,-36) 19(46,-44)
  rect 4.4x2 hole 1.5 square: 8(9,-37) 9(14,-36.75) 10(19,-36.5) 11(24,-36.25) 12(29,-36) 13(9.25,-28.5) 14(14.25,-28.25) 15(19.25,-28) 16(24.25,-27.75) 17(29.25,-27.5)
Top Assembly:
  lines w0.15: 0,-40.5 38,-40.5 ; 0,-40 0,-5.5 ; 0,2.5 38,2.5 ; 38,-40 38,-5.5
3D body: height 5, standoff -5, extent 0,2.5 5,3.5
3D body: height 5, standoff -5, extent 33,2.5 38,3.5
3D body: height 5, standoff -5, extent 33,-41.5 38,-40.5
3D body: height 5, standoff -5, extent 0,-41.5 5,-40.5
3D body: height 28, standoff 3, extent -4.5,-41.5 42.5,-40.5
3D body: height 28, standoff 3, extent -4.5,2.5 42.5,3.5
3D body "ER38.1-16-25.STEP": height 28.2, standoff 2.8, extent -0.05,-40.5 38.05,-32.5
3D body "ER38.1-16-25.STEP": height 28.2, standoff 2.8, extent -0.05,-32.5 38.05,-24.5
3D body "ER38.1-16-25.STEP": height 28.2, standoff 2.8, extent -0.05,-21.5 38.05,-13.5
3D body "ER38.1-16-25.STEP": height 28.2, standoff 2.8, extent -0.05,-5.5 38.05,2.5
3D body: height 28, standoff 3, extent 0,-24.5 38,-21.5
3D body "ER38.1-16-25.STEP": height 28.2, standoff 2.8, extent -0.05,-13.5 38.05,-5.5

## UU10 [mm]
pads (4):
  round 2.54 hole 1.524: 1(-4,3.5) 2(-4,-3.5) 3(4,3.5) 4(4,-3.5)
Top Overlay:
  lines w0.2: -7.75,-5.5 -7.75,5.5 7.75,5.5 7.75,-5.5 -7.75,-5.5
Top Assembly:
  lines w0.2: -6.4,-1.275 -6.4,-1.961 ; -6.4,1.425 -6.4,2.139 ; -4.05,-1.275 -4.05,-1.461 -6.4,-1.961 ; -4.05,1.425 -4.05,1.639 -6.4,2.139 ; -3.225,-4.925 -0.525,-4.925 -0.525,-3.425 ; -3.225,-3.425 -0.525,-3.425 ; -3.225,-1.275 -3.225,-2.225 ; -3.225,1.425 -3.225,2.375 ; -3.225,3.575 -0.525,3.575 ; -3.225,5.075 -0.525,5.075 -0.525,3.575 ; -0.525,-2.125 -0.5,-2.125 ; -0.525,-1.925 -0.5,-1.925 ; -0.525,-1.275 -0.525,-3.425 ; -0.525,1.425 -0.525,3.575 ; -0.525,2.075 -0.5,2.075 ; -0.525,2.275 -0.5,2.275 ; -0.5,-1.275 -0.5,-2.225 ; -0.5,1.425 -0.5,2.375 ; 0.5,-2.125 0.525,-2.125 ; 0.5,-1.925 0.525,-1.925 ; 0.5,-1.275 0.5,-2.225 ; 0.5,1.425 0.5,2.375 ; 0.5,2.075 0.525,2.075 ; 0.5,2.275 0.525,2.275 ; 0.525,-1.275 0.525,-3.425 ; 0.525,1.425 0.525,3.575 ; 3.225,-4.925 0.525,-4.925 0.525,-3.425 ; 3.225,-3.425 0.525,-3.425 ; 3.225,-1.275 3.225,-2.225 ; 3.225,1.425 3.225,2.375 ; 3.225,3.575 0.525,3.575 ; 3.225,5.075 0.525,5.075 0.525,3.575 ; 4.05,-1.275 4.05,-1.475 6.4,-1.961 ; 4.05,1.425 4.05,1.625 6.4,2.139 ; 6.4,-1.275 6.4,-1.961 ; 6.4,1.425 6.4,2.139 ; -7.296,-1.275 7.394,-1.275 ; -7.296,-1.275 -8.076,-1.275 -8.076,1.425 -7.296,1.425 ; -7.296,-1.275 -7.296,1.425 ; -7.296,1.425 7.394,1.425 ; -6.4,-2.225 -6.4,-1.961 ; -6.4,-2.225 -6.4,-5.225 -3.225,-5.225 -3.225,-2.225 ; -6.4,-2.225 -3.225,-2.225 ; -6.4,2.139 -6.4,2.375 ; -6.4,2.375 -6.4,5.375 -3.225,5.375 -3.225,2.375 ; -6.4,2.375 -3.225,2.375 ; -0.5,-2.225 -0.5,-5.225 0.5,-5.225 0.5,-2.225 ; -0.5,-2.225 0.5,-2.225 ; -0.5,2.375 -0.5,5.375 0.5,5.375 0.5,2.375 ; -0.5,2.375 0.5,2.375 ; 3.225,-2.225 3.225,-5.225 6.4,-5.225 6.4,-2.225 ; 3.225,-2.225 6.4,-2.225 ; 3.225,2.375 3.225,5.375 6.4,5.375 6.4,2.375 ; 3.225,2.375 6.4,2.375 ; 6.4,-2.225 6.4,-1.961 ; 6.4,2.139 6.4,2.375 ; 7.394,-1.275 8.083,-1.275 8.083,1.425 7.394,1.425 ; 7.394,-1.275 7.394,1.425
3D body "UU9.8-K_zlozenie.STEP": height 15.45, standoff -3, extent -7.781,-5.375 7.781,5.375

## UU16 [mm]
pads (4):
  round 2.54 hole 1.524: 1(-6.5,5) 2(-6.5,-5) 3(6.5,5) 4(6.5,-5)
Top Overlay:
  lines w0.254: -11,-9.5 -11,-0.3 -11,9 -0.5,9 11,9 11,-0.3 11,-9.5 1,-9.5 -11,-9.5
Top Assembly:
  drawing of 154 lines, arcs and shapes, not listed
3D body "User Library-UU16.step": height 24.35, standoff -5, extent -11.117,-9.5 11.117,9.2